# Altium schematic symbol library IC_TI.SCHLIB: 1162 symbols (part 1 of 8)
Pins are listed as number, name and electrical type; pins without a type are passive.

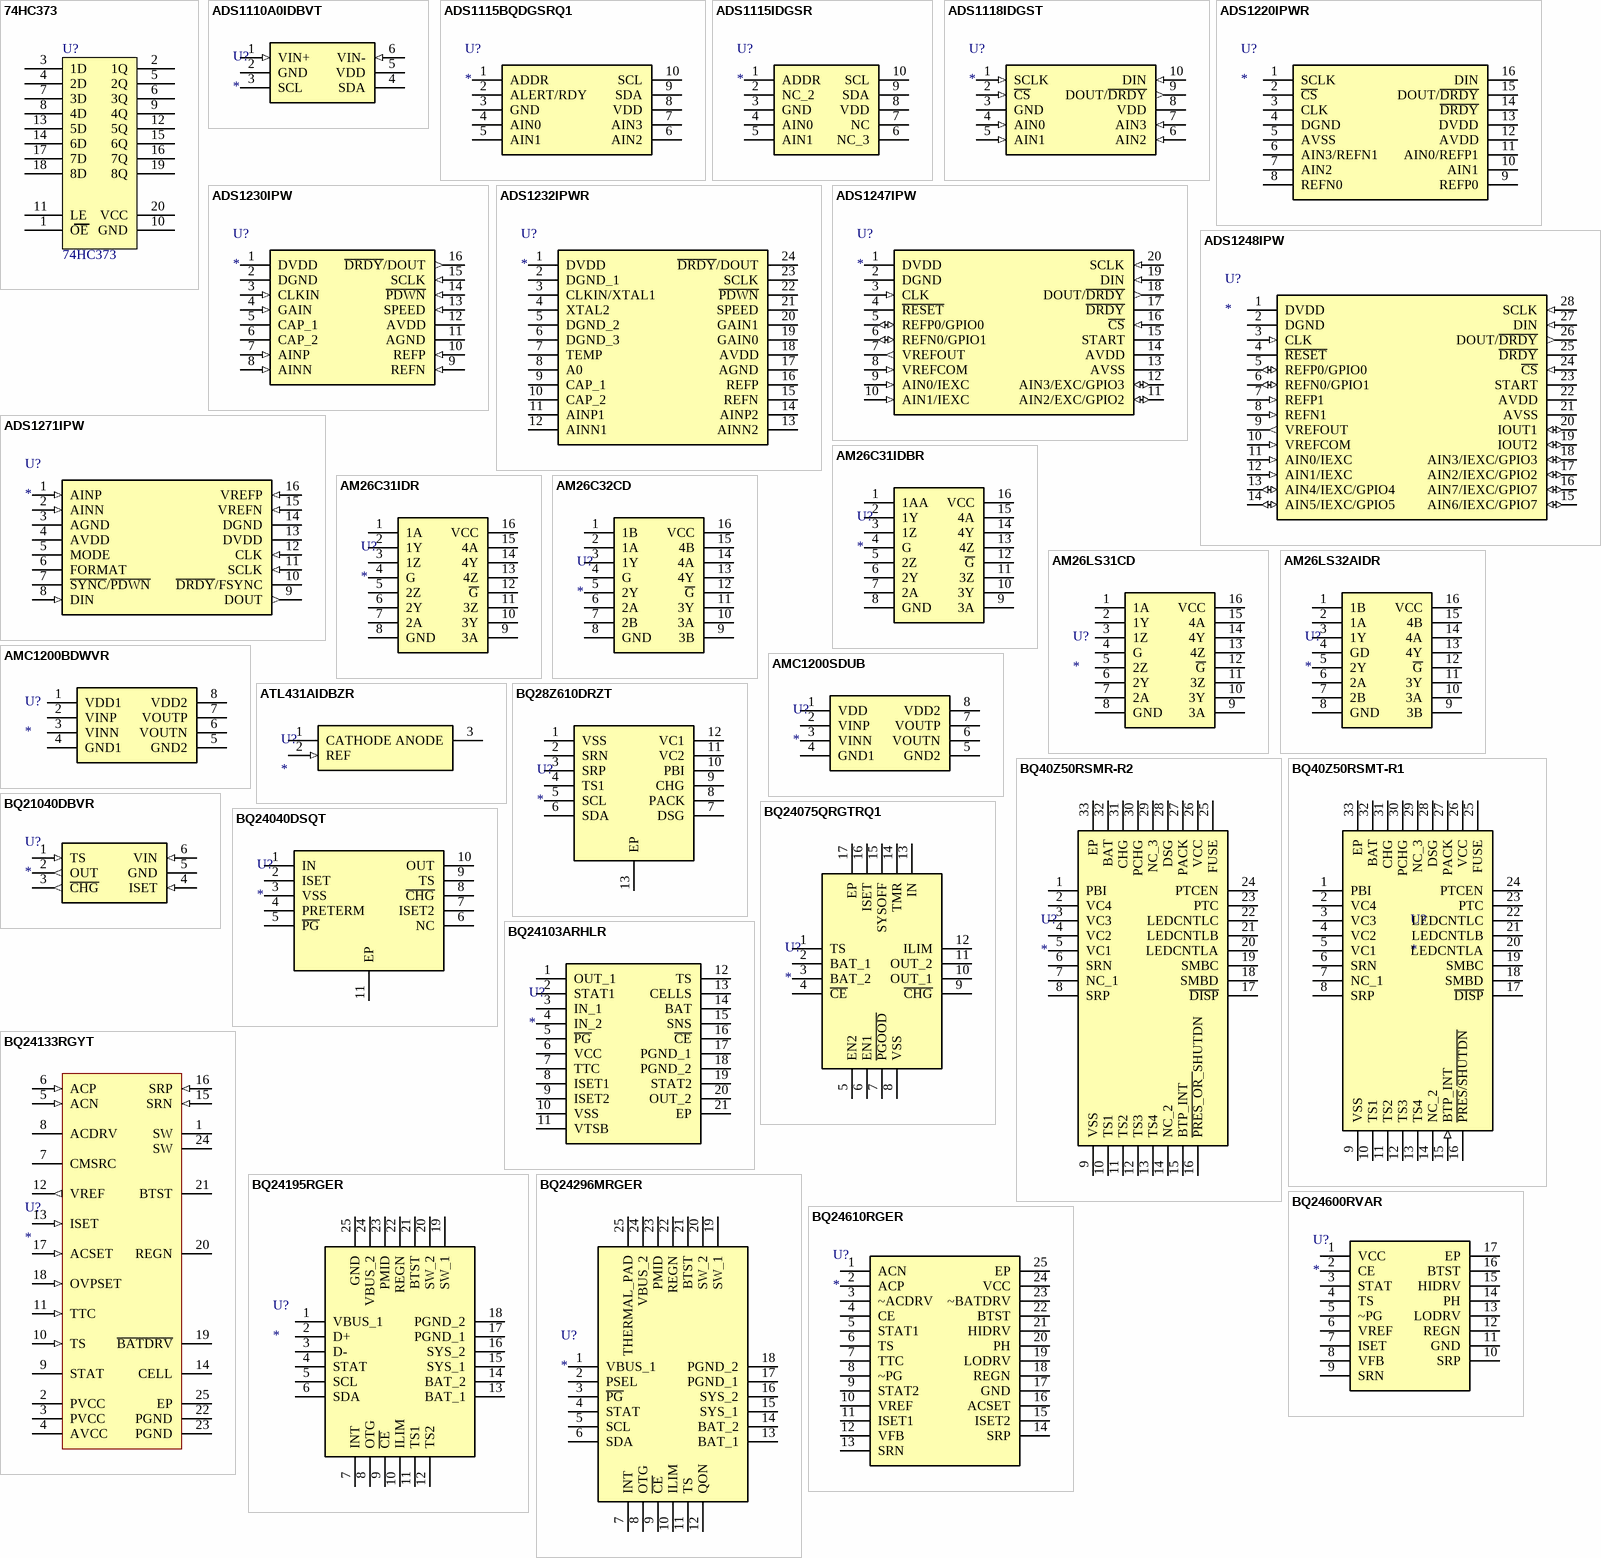
[diagram p0: symbols 74HC373 to BQ24610RGER]

## 74HC373
designator U?
footprint SOIC20W_1.27
pins: 1 OE, 2 1Q, 3 1D, 4 2D, 5 2Q, 6 3Q, 7 3D, 8 4D, 9 4Q, 10 GND, 11 LE, 12 5Q, 13 5D, 14 6D, 15 6Q, 16 7Q, 17 7D, 18 8D, 19 8Q, 20 VCC

## ADS1110A0IDBVT
designator U?
Integrated Circuit; Manufacturer_Name: Texas Instruments; Manufacturer_Part_Number: ADS1110A0IDBVT; Datasheet Link: http://www.ti.com/lit/ds/symlink/ads1110.pdf; Height: 1.45mm; Mouser Part Number: 595-ADS1110A0IDBVT; Mouser Price/Stock: https://www.mouser.com/Search/Refine.aspx?Keyword=595-ADS1110A0IDBVT; RS Part Number: 9233707; RS Price/Stock: http://uk.rs-online.com/web/p/products/9233707
footprint SOT23-6
pins: 1 VIN+ (in), 2 GND (power), 3 SCL, 4 SDA, 5 VDD (power), 6 VIN- (in)

## ADS1115BQDGSRQ1
designator U?
Integrated Circuit; Manufacturer_Name: Texas Instruments; Manufacturer_Part_Number: ADS1115BQDGSRQ1; Datasheet Link: http://www.ti.com/lit/gpn/ads1115-q1; Height: 1.1mm; Mouser Part Number: 595-ADS1115BQDGSRQ1; Mouser Price/Stock: https://www.mouser.com/Search/Refine.aspx?Keyword=595-ADS1115BQDGSRQ1
footprint VSSOP10_0.5
pins: 1 ADDR, 2 ALERT/RDY, 3 GND, 4 AIN0, 5 AIN1, 6 AIN2, 7 AIN3, 8 VDD, 9 SDA, 10 SCL

## ADS1115IDGSR
designator U?
Integrated Circuit; Manufacturer_Name: Texas Instruments; Manufacturer_Part_Number: ADS1115IDGSR; Mouser Part Number: 595-ADS1115IDGSR; Mouser Price/Stock: https://www.mouser.com/Search/Refine.aspx?Keyword=595-ADS1115IDGSR
footprint VSSOP10_0.5
pins: 1 ADDR, 2 NC_2, 3 GND, 4 AIN0, 5 AIN1, 6 NC_3, 7 NC, 8 VDD, 9 SDA, 10 SCL

## ADS1118IDGST
designator U?
Integrated Circuit; Manufacturer_Name: Texas Instruments; Manufacturer_Part_Number: ADS1118IDGST; Datasheet Link: http://www.ti.com/lit/ds/symlink/ads1118.pdf; Height: 1.1mm; Mouser Part Number: 595-ADS1118IDGST; Mouser Price/Stock: https://www.mouser.com/Search/Refine.aspx?Keyword=595-ADS1118IDGST; RS Part Number: 9215315; RS Price/Stock: http://uk.rs-online.com/web/p/products/9215315
footprint VSSOP10_0.5
pins: 1 SCLK (in), 2 ~{CS} (in), 3 GND (power), 4 AIN0 (in), 5 AIN1 (in), 6 AIN2 (in), 7 AIN3 (in), 8 VDD (power), 9 DOUT/~{DRDY} (out), 10 DIN (in)

## ADS1220IPWR
designator U?
Integrated Circuit; Manufacturer_Name: Texas Instruments; Manufacturer_Part_Number: ADS1220IPWR; Datasheet Link: http://www.ti.com/lit/gpn/ads1220; Height: 1.2mm; Mouser Part Number: 595-ADS1220IPWR; Mouser Price/Stock: https://www.mouser.com/Search/Refine.aspx?Keyword=595-ADS1220IPWR
footprint TSSOP16_0.65 (Shrink Small Outline; 16 Leads; Body Width 4.4 mm; Pitch 0.65 mm)
pins: 1 SCLK, 2 ~{CS}, 3 CLK, 4 DGND, 5 AVSS, 6 AIN3/REFN1, 7 AIN2, 8 REFN0, 9 REFP0, 10 AIN1, 11 AIN0/REFP1, 12 AVDD, 13 DVDD, 14 ~{DRDY}, 15 DOUT/~{DRDY}, 16 DIN

## ADS1230IPW
designator U?
Integrated Circuit; Manufacturer_Name: Texas Instruments; Manufacturer_Part_Number: ADS1230IPW; Datasheet Link: http://www.ti.com/lit/ds/symlink/ads1230.pdf; Height: 1.2mm; Mouser Part Number: 595-ADS1230IPW; Mouser Price/Stock: https://www.mouser.com/Search/Refine.aspx?Keyword=595-ADS1230IPW; RS Part Number: 6604188P; RS Price/Stock: http://uk.rs-online.com/web/p/products/6604188P
footprint TSSOP16_0.65 (Shrink Small Outline; 16 Leads; Body Width 4.4 mm; Pitch 0.65 mm)
pins: 1 DVDD (power), 2 DGND (power), 3 CLKIN (in), 4 GAIN (in), 5 CAP_1, 6 CAP_2, 7 AINP (in), 8 AINN (in), 9 REFN (in), 10 REFP (in), 11 AGND (power), 12 AVDD (power), 13 SPEED (in), 14 ~{PDWN} (in), 15 SCLK (in), 16 ~{DRDY}/DOUT (out)

## ADS1232IPWR
designator U?
Integrated Circuit; Manufacturer_Name: Texas Instruments; Manufacturer_Part_Number: ADS1232IPWR; Datasheet Link: http://www.ti.com/lit/ds/symlink/ads1232.pdf; Height: 1.2mm; Mouser Part Number: 595-ADS1232IPWR; Mouser Price/Stock: https://www.mouser.com/Search/Refine.aspx?Keyword=595-ADS1232IPWR
footprint TSSOP24_0.65 (TSOP, 24-Leads, Body 7.80x4.40mm, Pitch 0.65mm, Thermal Pad 5.16x2.40mm, IPC Low Density)
pins: 1 DVDD, 2 DGND_1, 3 CLKIN/XTAL1, 4 XTAL2, 5 DGND_2, 6 DGND_3, 7 TEMP, 8 A0, 9 CAP_1, 10 CAP_2, 11 AINP1, 12 AINN1, 13 AINN2, 14 AINP2, 15 REFN, 16 REFP, 17 AGND, 18 AVDD, 19 GAIN0, 20 GAIN1, 21 SPEED, 22 ~{PDWN}, 23 SCLK, 24 ~{DRDY}/DOUT

## ADS1247IPW
designator U?
Integrated Circuit; Manufacturer_Name: Texas Instruments; Manufacturer_Part_Number: ADS1247IPW; Datasheet Link: http://docs-emea.rs-online.com/webdocs/0e92/0900766b80e92e4c.pdf; Height: 1.2mm; Mouser Part Number: 595-ADS1247IPW; Mouser Price/Stock: https://www.mouser.com/Search/Refine.aspx?Keyword=595-ADS1247IPW; RS Part Number: 7091930P; RS Price/Stock: http://uk.rs-online.com/web/p/products/7091930P
footprint TSSOP20_0.65 (TSOP, 20-Leads, Body 6.6x4.5mm (max), Pitch 0.65mm, IPC Medium Density)
pins: 1 DVDD (power), 2 DGND (power), 3 CLK (in), 4 ~{RESET}, 5 REFP0/GPIO0 (io), 6 REFN0/GPIO1 (io), 7 VREFOUT (out), 8 VREFCOM (in), 9 AIN0/IEXC (in), 10 AIN1/IEXC (in), 11 AIN2/EXC/GPIO2 (io), 12 AIN3/EXC/GPIO3 (io), 13 AVSS (power), 14 AVDD (power), 15 START, 16 ~{CS} (in), 17 ~{DRDY}, 18 DOUT/~{DRDY} (out), 19 DIN (in), 20 SCLK (in)

## ADS1248IPW
designator U?
Integrated Circuit; Manufacturer_Name: Texas Instruments; Manufacturer_Part_Number: ADS1248IPW; Datasheet Link: http://www.ti.com/lit/ds/symlink/ads1248.pdf; Height: 1.2mm; Mouser Part Number: 595-ADS1248IPW; Mouser Price/Stock: https://www.mouser.com/Search/Refine.aspx?Keyword=595-ADS1248IPW; RS Part Number: 7091921P; RS Price/Stock: http://uk.rs-online.com/web/p/products/7091921P
footprint TSSOP28_0.65
pins: 1 DVDD (power), 2 DGND (power), 3 CLK (in), 4 ~{RESET}, 5 REFP0/GPIO0 (io), 6 REFN0/GPIO1 (io), 7 REFP1 (in), 8 REFN1 (in), 9 VREFOUT (out), 10 VREFCOM (in), 11 AIN0/IEXC (in), 12 AIN1/IEXC (in), 13 AIN4/IEXC/GPIO4 (io), 14 AIN5/IEXC/GPIO5 (io), 15 AIN6/IEXC/GPIO7 (io), 16 AIN7/IEXC/GPIO7 (io), 17 AIN2/IEXC/GPIO2 (io), 18 AIN3/IEXC/GPIO3 (io), 19 IOUT2 (io), 20 IOUT1 (io), 21 AVSS (power), 22 AVDD (power), 23 START, 24 ~{CS} (in), 25 ~{DRDY}, 26 DOUT/~{DRDY} (out), 27 DIN (in), 28 SCLK (in)

## ADS1271IPW
designator U?
Integrated Circuit; Manufacturer_Name: Texas Instruments; Manufacturer_Part_Number: ADS1271IPW; Datasheet Link: http://www.ti.com/lit/ds/symlink/ads1271.pdf; Height: 1.2mm; Mouser Part Number: 595-ADS1271IPW; Mouser Price/Stock: https://www.mouser.com/Search/Refine.aspx?Keyword=595-ADS1271IPW; RS Part Number: 5457372P; RS Price/Stock: http://uk.rs-online.com/web/p/products/5457372P
footprint TSSOP16_0.65 (Shrink Small Outline; 16 Leads; Body Width 4.4 mm; Pitch 0.65 mm)
pins: 1 AINP (in), 2 AINN (in), 3 AGND (power), 4 AVDD (power), 5 MODE, 6 FORMAT, 7 ~{SYNC}/~{PDWN}, 8 DIN (in), 9 DOUT (out), 10 ~{DRDY}/FSYNC, 11 SCLK (in), 12 CLK (in), 13 DVDD (power), 14 DGND (power), 15 VREFN (in), 16 VREFP (in)

## AM26C31IDBR
designator U?
Integrated Circuit; Manufacturer_Name: Texas Instruments; Manufacturer_Part_Number: AM26C31IDBR; Datasheet Link: http://www.ti.com/lit/gpn/am26c31; Height: 2mm; Mouser Part Number: 595-AM26C31IDBR; Mouser Price/Stock: https://www.mouser.com/Search/Refine.aspx?Keyword=595-AM26C31IDBR
footprint SSOP16_0.65
pins: 1 1AA, 2 1Y, 3 1Z, 4 G, 5 2Z, 6 2Y, 7 2A, 8 GND, 9 3A, 10 3Y, 11 3Z, 12 ~{G}, 13 4Z, 14 4Y, 15 4A, 16 VCC

## AM26C31IDR
designator U?
Integrated Circuit; Manufacturer_Name: Texas Instruments; Manufacturer_Part_Number: AM26C31IDR; Datasheet Link: http://www.ti.com/lit/ds/symlink/am26c31.pdf; Height: 1.75mm; Mouser Part Number: 595-AM26C31IDR; Mouser Price/Stock: https://www.mouser.com/Search/Refine.aspx?Keyword=595-AM26C31IDR; RS Part Number: 6608164P; RS Price/Stock: http://uk.rs-online.com/web/p/products/6608164P
footprint SOIC16_1.27
pins: 1 1A, 2 1Y, 3 1Z, 4 G, 5 2Z, 6 2Y, 7 2A, 8 GND (power), 9 3A, 10 3Y, 11 3Z, 12 ~{G}, 13 4Z, 14 4Y, 15 4A, 16 VCC (power)

## AM26C32CD
designator U?
Integrated Circuit; Manufacturer_Name: Texas Instruments; Manufacturer_Part_Number: AM26C32CD; Datasheet Link: http://www.ti.com/lit/ds/symlink/am26c32.pdf; Height: 1.75mm; Mouser Part Number: 595-AM26C32CD; Mouser Price/Stock: https://www.mouser.com/Search/Refine.aspx?Keyword=595-AM26C32CD; RS Part Number: 5170542P; RS Price/Stock: http://uk.rs-online.com/web/p/products/5170542P
footprint SOIC16_1.27
pins: 1 1B, 2 1A, 3 1Y, 4 G, 5 2Y, 6 2A, 7 2B, 8 GND (power), 9 3B, 10 3A, 11 3Y, 12 ~{G}, 13 4Y, 14 4A, 15 4B, 16 VCC (power)

## AM26LS31CD
designator U?
Integrated Circuit; Manufacturer_Name: Texas Instruments; Manufacturer_Part_Number: AM26LS31CD; Datasheet Link: http://www.ti.com/lit/ds/symlink/am26ls31.pdf; Height: 1.75mm; Mouser Part Number: 595-AM26LS31CD; Mouser Price/Stock: https://www.mouser.com/Search/Refine.aspx?Keyword=595-AM26LS31CD; RS Part Number: 5173119P; RS Price/Stock: http://uk.rs-online.com/web/p/products/5173119P
footprint SOIC16_1.27
pins: 1 1A, 2 1Y, 3 1Z, 4 G, 5 2Z, 6 2Y, 7 2A, 8 GND (power), 9 3A, 10 3Y, 11 3Z, 12 ~{G}, 13 4Z, 14 4Y, 15 4A, 16 VCC (power)

## AM26LS32AIDR
designator U?
Integrated Circuit; Manufacturer_Name: Texas Instruments; Manufacturer_Part_Number: AM26LS32AIDR; Datasheet Link: http://www.ti.com/lit/gpn/am26ls32a; Height: 1.75mm; Mouser Part Number: 595-AM26LS32AIDR; Mouser Price/Stock: https://www.mouser.com/Search/Refine.aspx?Keyword=595-AM26LS32AIDR
footprint SOIC16_1.27
pins: 1 1B, 2 1A, 3 1Y, 4 GD, 5 2Y, 6 2A, 7 2B, 8 GND, 9 3B, 10 3A, 11 3Y, 12 ~{G}, 13 4Y, 14 4A, 15 4B, 16 VCC

## AMC1200BDWVR
designator U?
Integrated Circuit; Manufacturer_Name: Texas Instruments; Manufacturer_Part_Number: AMC1200BDWVR; Datasheet Link: http://www.ti.com/lit/gpn/amc1200; Height: 2.8mm; Mouser Part Number: 595-AMC1200BDWVR; Mouser Price/Stock: https://www.mouser.com/Search/Refine.aspx?Keyword=595-AMC1200BDWVR
footprint SOIC8W_1.27
pins: 1 VDD1, 2 VINP, 3 VINN, 4 GND1, 5 GND2, 6 VOUTN, 7 VOUTP, 8 VDD2

## AMC1200SDUB
designator U?
Integrated Circuit; Manufacturer_Name: Texas Instruments; Manufacturer_Part_Number: AMC1200SDUB; Datasheet Link: http://www.farnell.com/datasheets/1973077.pdf; Height: 4.85mm; Mouser Part Number: 595-AMC1200SDUB; Mouser Price/Stock: https://www.mouser.com/Search/Refine.aspx?Keyword=595-AMC1200SDUB; RS Part Number: 8175789P; RS Price/Stock: http://uk.rs-online.com/web/p/products/8175789P
footprint SOP8 (SOP, 8-Leads, Body 9.6x6.7mm (max), Pitch 2.54mm, IPC Medium Density)
pins: 1 VDD, 2 VINP, 3 VINN, 4 GND1, 5 GND2, 6 VOUTN, 7 VOUTP, 8 VDD2

## ATL431AIDBZR
designator U?
Integrated Circuit; Manufacturer_Name: Texas Instruments; Manufacturer_Part_Number: ATL431AIDBZR; Datasheet Link: http://www.ti.com/lit/ds/symlink/atl431.pdf; Height: 1.12mm; Mouser Part Number: 595-ATL431AIDBZR; Mouser Price/Stock: https://www.mouser.com/Search/Refine.aspx?Keyword=595-ATL431AIDBZR; RS Part Number: 7974816
footprint SOT23-3 (贴片MOS的SOT-23封装)
pins: 1 CATHODE, 2 REF (in), 3 ANODE

## BQ28Z610DRZT
designator U?
Integrated Circuit; Manufacturer_Name: Texas Instruments; Manufacturer_Part_Number: BQ28Z610DRZT; Datasheet Link: http://www.ti.com/lit/ds/symlink/bq28z610.pdf; Height: 1mm; Mouser Part Number: 595-BQ28Z610DRZT; Mouser Price/Stock: https://www.mouser.com/Search/Refine.aspx?Keyword=595-BQ28Z610DRZT
footprint DFN12_0.4-PAD(2.5X4)
pins: 1 VSS, 2 SRN, 3 SRP, 4 TS1, 5 SCL, 6 SDA, 7 DSG, 8 PACK, 9 CHG, 10 PBI, 11 VC2, 12 VC1, 13 EP

## BQ40Z50RSMR-R2
designator U?
Integrated Circuit; Manufacturer_Name: Texas Instruments; Manufacturer_Part_Number: BQ40Z50RSMR-R2; Datasheet Link: http://www.ti.com/lit/gpn/bq40z50-r2; Height: 1mm; Mouser Part Number: 595-BQ40Z50RSMR-R2; Mouser Price/Stock: https://www.mouser.com/Search/Refine.aspx?Keyword=595-BQ40Z50RSMR-R2
footprint QFN32_0.4-PAD(4X4) (QFN, 32-Leads, Body 5.2x5.2mm (max), Pitch 0.50mm, IPC Medium Density)
pins: 1 PBI, 2 VC4, 3 VC3, 4 VC2, 5 VC1, 6 SRN, 7 NC_1, 8 SRP, 9 VSS, 10 TS1, 11 TS2, 12 TS3, 13 TS4, 14 NC_2, 15 BTP_INT, 16 ~{PRES_OR_}SHUTDN, 17 ~{DISP}, 18 SMBD, 19 SMBC, 20 LEDCNTLA, 21 LEDCNTLB, 22 LEDCNTLC, 23 PTC, 24 PTCEN, 25 FUSE, 26 VCC, 27 PACK, 28 DSG, 29 NC_3, 30 PCHG, 31 CHG, 32 BAT, 33 EP

## BQ40Z50RSMT-R1
designator U?
Integrated Circuit; Manufacturer_Name: Texas Instruments; Manufacturer_Part_Number: BQ40Z50RSMT-R1; Datasheet Link: http://www.ti.com/lit/ds/symlink/bq40z50-r1.pdf; Height: 1mm; Mouser Part Number: 595-BQ40Z50RSMT-R1; Mouser Price/Stock: https://www.mouser.com/Search/Refine.aspx?Keyword=595-BQ40Z50RSMT-R1; RS Part Number: 1330141; RS Price/Stock: http://uk.rs-online.com/web/p/products/1330141
footprint QFN32_0.4-PAD(4X4) (QFN, 32-Leads, Body 5.2x5.2mm (max), Pitch 0.50mm, IPC Medium Density)
pins: 1 PBI, 2 VC4, 3 VC3, 4 VC2, 5 VC1, 6 SRN, 7 NC_1, 8 SRP, 9 VSS (power), 10 TS1, 11 TS2, 12 TS3, 13 TS4, 14 NC_2, 15 BTP_INT (in), 16 ~{PRES}/~{SHUTDN}, 17 ~{DISP}, 18 SMBD, 19 SMBC, 20 LEDCNTLA, 21 LEDCNTLB, 22 LEDCNTLC, 23 PTC, 24 PTCEN, 25 FUSE, 26 VCC (power), 27 PACK, 28 DSG, 29 NC_3, 30 PCHG, 31 CHG, 32 BAT, 33 EP

## BQ21040DBVR
designator U?
Integrated Circuit; Manufacturer_Name: Texas Instruments; Manufacturer_Part_Number: BQ21040DBVR; Datasheet Link: http://www.ti.com/lit/gpn/bq21040; Height: 1.45mm; Mouser Part Number: 595-BQ21040DBVR; Mouser Price/Stock: https://www.mouser.com/Search/Refine.aspx?Keyword=595-BQ21040DBVR
footprint SOT23-6
pins: 1 TS (in), 2 OUT (out), 3 ~{CHG} (out), 4 ISET (in), 5 GND (power), 6 VIN (in)

## BQ24040DSQT
designator U?
Integrated Circuit; Manufacturer_Name: Texas Instruments; Manufacturer_Part_Number: BQ24040DSQT; Datasheet Link: http://www.ti.com/lit/ds/symlink/bq24040.pdf; Height: 0.8mm; Mouser Part Number: 595-BQ24040DSQT; Mouser Price/Stock: https://www.mouser.com/Search/Refine.aspx?Keyword=595-BQ24040DSQT; RS Part Number: 1628082; RS Price/Stock: http://uk.rs-online.com/web/p/products/1628082
footprint DFN10_0.4-PAD(2X2)
pins: 1 IN, 2 ISET, 3 VSS, 4 PRETERM, 5 ~{PG}, 6 NC, 7 ISET2, 8 ~{CHG}, 9 TS, 10 OUT, 11 EP

## BQ24075QRGTRQ1
designator U?
Integrated Circuit; Manufacturer_Name: Texas Instruments; Manufacturer_Part_Number: BQ24075QRGTRQ1; Datasheet Link: http://www.ti.com/lit/gpn/bq24075-q1; Height: 1mm; Mouser Part Number: 595-BQ24075QRGTRQ1; Mouser Price/Stock: https://www.mouser.com/Search/Refine.aspx?Keyword=595-BQ24075QRGTRQ1
footprint QFN16_0.5-PAD(3X3) (QFN, 16-Leads, Body 3.0x3.0mm (max), Pitch 0.50mm, IPC Low Density)
pins: 1 TS, 2 BAT_1, 3 BAT_2, 4 ~{CE}, 5 EN2, 6 EN1, 7 ~{PGOOD}, 8 VSS, 9 ~{CHG}, 10 OUT_1, 11 OUT_2, 12 ILIM, 13 IN, 14 TMR, 15 SYSOFF, 16 ISET, 17 EP

## BQ24103ARHLR
designator U?
Integrated Circuit; Manufacturer_Name: Texas Instruments; Manufacturer_Part_Number: BQ24103ARHLR; Datasheet Link: http://www.ti.com/lit/gpn/bq24103a; Mouser Part Number: 595-BQ24103ARHLR; Mouser Price/Stock: https://www.mouser.com/Search/Refine.aspx?Keyword=595-BQ24103ARHLR
footprint BQ51050BRHLR
pins: 1 OUT_1, 2 STAT1, 3 IN_1, 4 IN_2, 5 ~{PG}, 6 VCC, 7 TTC, 8 ISET1, 9 ISET2, 10 VSS, 11 VTSB, 12 TS, 13 CELLS, 14 BAT, 15 SNS, 16 ~{CE}, 17 PGND_1, 18 PGND_2, 19 STAT2, 20 OUT_2, 21 EP

## BQ24133RGYT
designator U?
Integrated Circuit; Manufacturer_Name: Texas Instruments; Manufacturer_Part_Number: BQ24133RGYT; Datasheet Link: http://www.ti.com/lit/ds/symlink/bq24133.pdf; Mouser Part Number: 595-BQ24133RGYT; Mouser Price/Stock: https://www.mouser.com/Search/Refine.aspx?Keyword=595-BQ24133RGYT; RS Part Number: 8279263P; RS Price/Stock: http://uk.rs-online.com/web/p/products/8279263P
footprint VQFN24_0.5-PAD(3.5X5.5)
pins: 1 SW (power) "Switching node, charge current output inductor connection. Connect the 0.047-uF bootstrap capacitor from SW to BTST.", 2 PVCC (power) "Charger input voltage. Connect at least 10-uF ceramic capacitor from PVCC to PGND and place it as close as possible to IC", 3 PVCC (power) "Charger input voltage. Connect at least 10-uF ceramic capacitor from PVCC to PGND and place it as close as possible to IC", 4 AVCC (power) "IC power positive supply. Place a 1-uF ceramic capacitor from AVCC to AGND and place it as close as possible to IC. Place a 10-ohm resistor from input side to AVCC pin to filter the noise. For 5V input, a 5-ohm resistor is (See Datasheet)", 5 ACN (in) "Adapter current sense resistor negative input. A 0.1-uF ceramic capacitor is placed from ACN to ACP to provide differential-mode filtering. An optional 0.1-uF ceramic capacitor is placed from ACN pin to AGND for common-mode (See Datasheet)", 6 ACP (in) "Adapter current sense resistor positive input. A 0.1-uF ceramic capacitor is placed from ACN to ACP to provide differential-mode filtering. A 0.1-uF ceramic capacitor is placed from ACP pin to AGND for common-mode filtering.", 7 CMSRC "Connect to common source of N-channel ACFET and reverse blocking MOSFET (RBFET). Place 4-kohm resistor from CMSRC pin to the common source of ACFET and RBFET to control the turn-on speed. The resistance between ACDRV and (See Datasheet)", 8 ACDRV "AC adapter to system switch driver output. Connect to 4-kohm resistor then to the gate of the ACFET N-channel power MOSFET and the reverse conduction blocking N-channel power MOSFET. Connect both FETs as common-source. The (See Datasheet)", 9 STAT (hiz) "Open-drain charge status pin with 10-k ohm pull up to power rail. The STAT pin can be used to drive LED or communicate with the host processor. It indicates various charger operations: LOW when charge in progress. HIGH when (See Datasheet)", 10 TS (in) "Temperature qualification voltage input. Connect a negative temperature coefficient thermistor. Program the hot and cold temperature window with a resistor divider from VREF to TS to AGND. The temperature qualification (See Datasheet)", 11 TTC (in) "Safety Timer and termination control. Connect a capacitor from this node to AGND to set the fast charge safety timer(5.6min/nF). Pre-charge timer is internally fixed to 30 minutes. Pull the TTC to LOW to disable the charge (See Datasheet)", 12 VREF (out) "3.3V reference voltage output. Place a 1-uF ceramic capacitor from VREF to AGND pin close to the IC. This voltage could be used for programming ISET and ACSET and TS pins. It may also serve as the pull-up rail of STAT pin (See Datasheet)", 13 ISET (in) "Fast charge current set point. Use a voltage divider from VREF to ISET to AGND to set the fast charge current: ICHG=VISET/(20*RSR) The pre-charge and termination current is internally as one tenth of the charge current. The (See Datasheet)", 14 CELL "Cell selection pin. Set CELL pin LOW for 1-cell, Float for 2-cell (0.8V-1.8V), and HIGH for 3-cell with a fixed 4.2V per cell.", 15 SRN (in) "Charge current sense resistor negative input. A 0.1-uF ceramic capacitor is placed from SRN to SRP to provide differential-mode filtering. A 0.1-uF ceramic capacitor is placed from SRN pin to AGND for common-mode filtering.", 16 SRP (in) "Charge current sense resistor, positive input. A 0.1-uF ceramic capacitor is placed from SRN to SRP to provide differential-mode filtering. A 0.1-uF ceramic capacitor is placed from SRP pin to AGND for common-mode filtering.", 17 ACSET (in) "Input current set point. Use a voltage divider from VREF to ACSET to AGND to set this value:IDPM=VACSET/(20*RAC)", 18 OVPSET (in) "Valid input voltage set point. Use a voltage divider from input to OVPSET to AGND to set this voltage. The voltage above internal 1.6V reference indicates input over-voltage, and the voltage below internal 0.5V reference (See Datasheet)", 19 ~{BATDRV} "Battery discharge MOSFET gate driver output. Connect to 1kohm resistor to the gate of the BATFET P-channel power MOSFET. Connect the source of the BATFET to the system load voltage node. Connect the drain of the BATFET to (See Datasheet)", 20 REGN (power) "PWM low side driver positive 6V supply output. Connect a 1-uF ceramic capacitor from REGN to PGND pin, close to the IC. Generate high-side driver bootstrap voltage by integrated diode from REGN to BTST", 21 BTST (power) "PWM high side driver positive supply. Connect the 0.047-uF bootstrap capacitor from SW to BTST.", 22 PGND (power) "Power ground. Ground connection for high-current power converter node. On PCB layout, connect directly to ground connection of input and output capacitors of the charger. Only connect to AGND through the Thermal Pad (See Datasheet)", 23 PGND (power) "Power ground. Ground connection for high-current power converter node. On PCB layout, connect directly to ground connection of input and output capacitors of the charger. Only connect to AGND through the Thermal Pad (See Datasheet)", 24 SW (power) "Switching node, charge current output inductor connection. Connect the 0.047-uF bootstrap capacitor from SW to BTST.", 25 EP (power) "Exposed pad beneath the IC. Always solder Thermal Pad to the board, and have vias on the Thermal  Pad plane star-connecting to AGND and ground plane for high-current power converter. It dissipates the heat from the IC."

## BQ24195RGER
designator U?
Integrated Circuit; Manufacturer_Name: Texas Instruments; Manufacturer_Part_Number: BQ24195RGER; Datasheet Link: http://www.ti.com/lit/ds/symlink/bq24195.pdf; Height: 1mm; Mouser Part Number: 595-BQ24195RGER; Mouser Price/Stock: https://www.mouser.com/Search/Refine.aspx?Keyword=595-BQ24195RGER
footprint QFN24_0.5-PAD(4X4) (QFN, 24-Leads, Body 4.1x4.1mm (max), Pitch 0.50mm, IPC Medium Density)
pins: 1 VBUS_1, 2 D+, 3 D-, 4 STAT, 5 SCL, 6 SDA, 7 INT, 8 OTG, 9 ~{CE}, 10 ILIM, 11 TS1, 12 TS2, 13 BAT_1, 14 BAT_2, 15 SYS_1, 16 SYS_2, 17 PGND_1, 18 PGND_2, 19 SW_1, 20 SW_2, 21 BTST, 22 REGN, 23 PMID, 24 VBUS_2, 25 GND

## BQ24296MRGER
designator U?
Integrated Circuit; Manufacturer_Name: Texas Instruments; Manufacturer_Part_Number: BQ24296MRGER; Datasheet Link: http://www.ti.com/lit/gpn/bq24296m; Height: 1mm; Mouser Part Number: 595-BQ24296MRGER; Mouser Price/Stock: https://www.mouser.com/Search/Refine.aspx?Keyword=595-BQ24296MRGER
footprint QFN24_0.5-PAD(4X4) (QFN, 24-Leads, Body 4.1x4.1mm (max), Pitch 0.50mm, IPC Medium Density)
pins: 1 VBUS_1, 2 PSEL, 3 ~{PG}, 4 STAT, 5 SCL, 6 SDA, 7 INT, 8 OTG, 9 ~{CE}, 10 ILIM, 11 TS, 12 QON, 13 BAT_1, 14 BAT_2, 15 SYS_1, 16 SYS_2, 17 PGND_1, 18 PGND_2, 19 SW_1, 20 SW_2, 21 BTST, 22 REGN, 23 PMID, 24 VBUS_2, 25 THERMAL_PAD

## BQ24600RVAR
designator U?
Integrated Circuit; Manufacturer_Name: Texas Instruments; Manufacturer_Part_Number: BQ24600RVAR; Datasheet Link: http://www.ti.com/lit/gpn/bq24600; Mouser Part Number: 595-BQ24600RVAR; Mouser Price/Stock: https://www.mouser.com/Search/Refine.aspx?Keyword=595-BQ24600RVAR
footprint QFN16_0.5-PAD(3.5X3.5)
pins: 1 VCC, 2 CE, 3 STAT, 4 TS, 5 ~PG, 6 VREF, 7 ISET, 8 VFB, 9 SRN, 10 SRP, 11 GND, 12 REGN, 13 LODRV, 14 PH, 15 HIDRV, 16 BTST, 17 EP

## BQ24610RGER
designator U?
Integrated Circuit; Manufacturer_Name: Texas Instruments; Manufacturer_Part_Number: BQ24610RGER; Datasheet Link: http://www.ti.com/lit/gpn/bq24610; Mouser Part Number: 595-BQ24610RGER; Mouser Price/Stock: https://www.mouser.com/Search/Refine.aspx?Keyword=595-BQ24610RGER
footprint QFN24_0.5-PAD(4X4) (QFN, 24-Leads, Body 4.1x4.1mm (max), Pitch 0.50mm, IPC Medium Density)
pins: 1 ACN, 2 ACP, 3 ~ACDRV, 4 CE, 5 STAT1, 6 TS, 7 TTC, 8 ~PG, 9 STAT2, 10 VREF, 11 ISET1, 12 VFB, 13 SRN, 14 SRP, 15 ISET2, 16 ACSET, 17 GND, 18 REGN, 19 LODRV, 20 PH, 21 HIDRV, 22 BTST, 23 ~BATDRV, 24 VCC, 25 EP

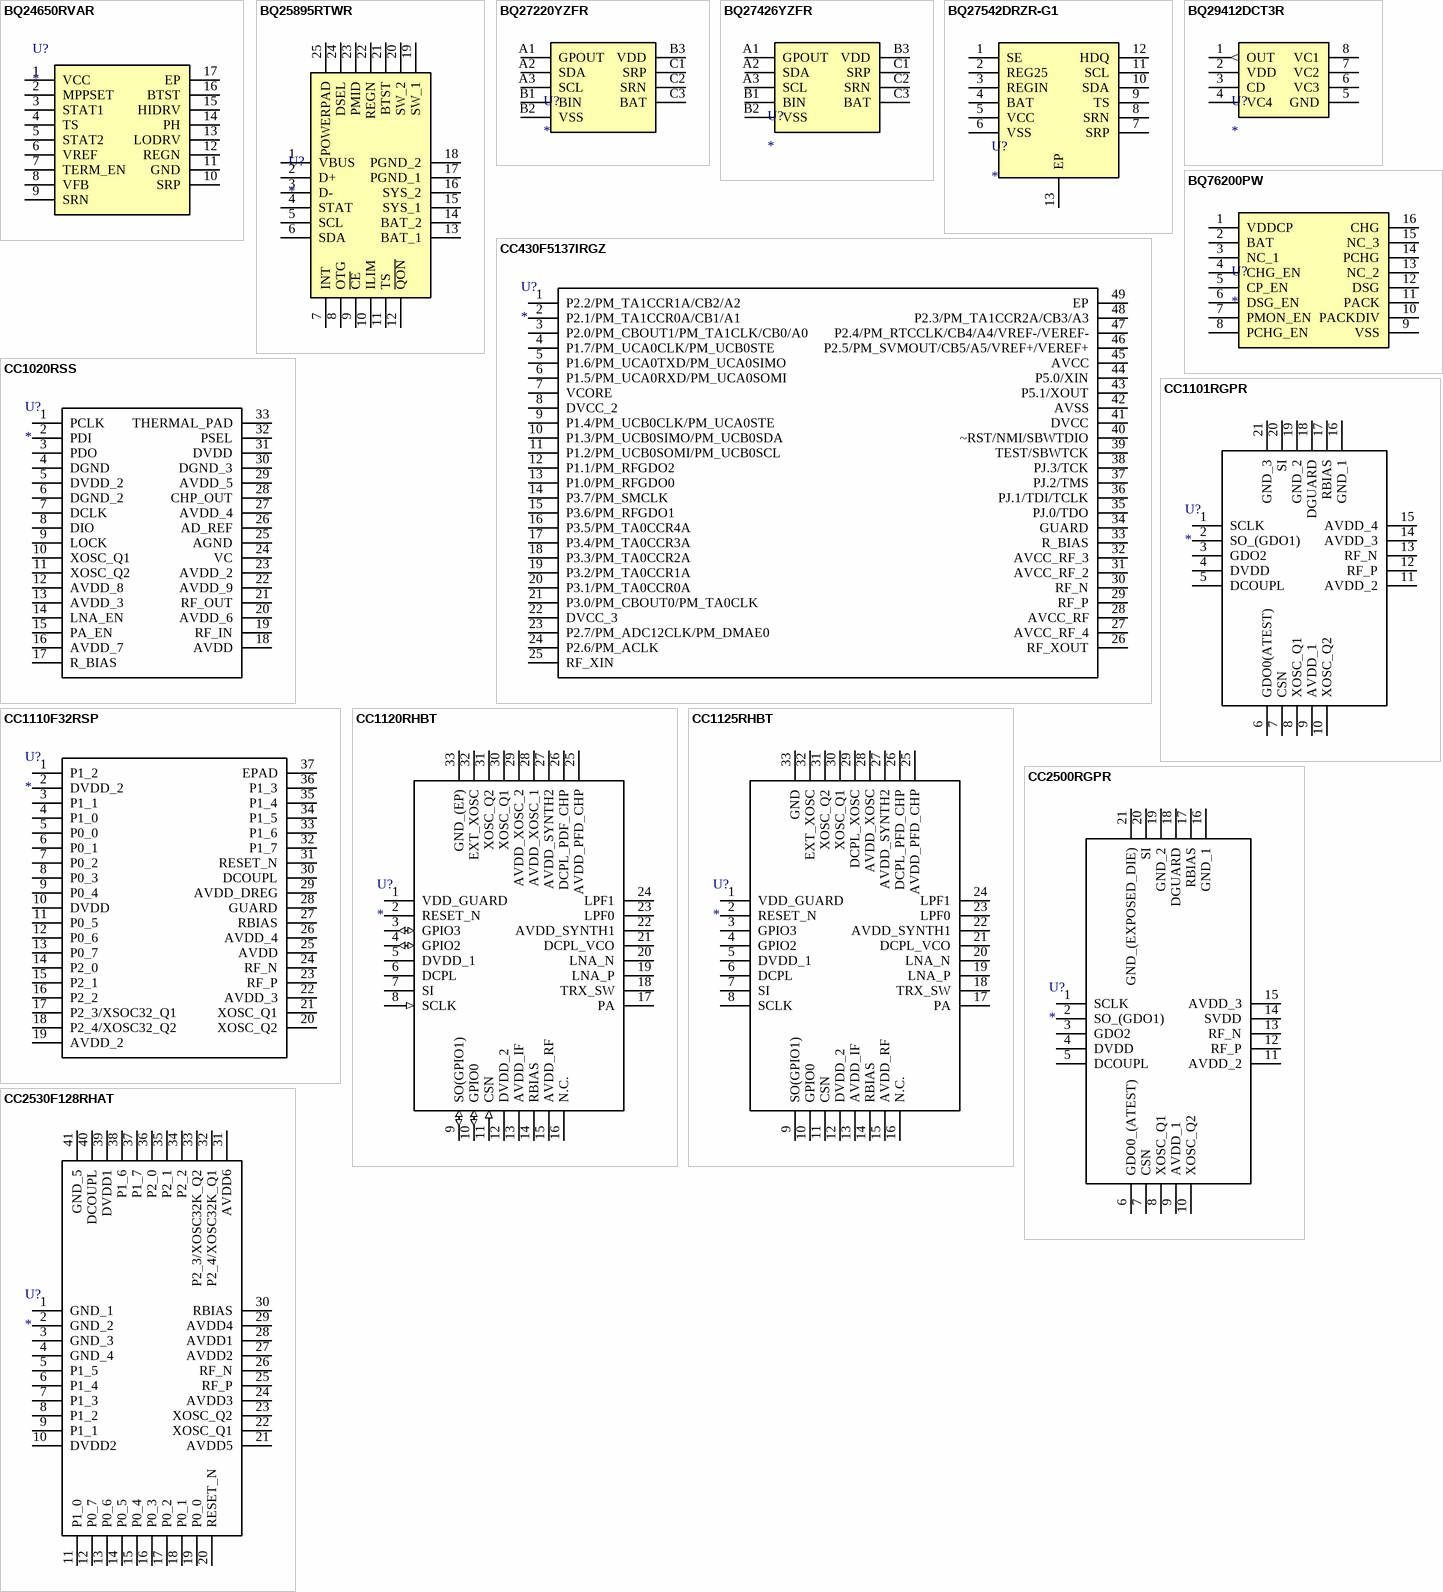
[diagram p1: symbols BQ24650RVAR to CC2530F128RHAT]

## BQ24650RVAR
designator U?
Integrated Circuit; Manufacturer_Name: Texas Instruments; Manufacturer_Part_Number: BQ24650RVAR; Mouser Part Number: 595-BQ24650RVAR; Mouser Price/Stock: https://www.mouser.com/Search/Refine.aspx?Keyword=595-BQ24650RVAR
footprint QFN16_0.5-PAD(3.5X3.5)
pins: 1 VCC, 2 MPPSET, 3 STAT1, 4 TS, 5 STAT2, 6 VREF, 7 TERM_EN, 8 VFB, 9 SRN, 10 SRP, 11 GND, 12 REGN, 13 LODRV, 14 PH, 15 HIDRV, 16 BTST, 17 EP

## BQ25895RTWR
designator U?
Integrated Circuit; Manufacturer_Name: Texas Instruments; Manufacturer_Part_Number: BQ25895RTWR; Datasheet Link: http://www.ti.com/lit/gpn/bq25895; Height: 0.8mm; Mouser Part Number: 595-BQ25895RTWR; Mouser Price/Stock: https://www.mouser.com/Search/Refine.aspx?Keyword=595-BQ25895RTWR
footprint QFN24_0.5-PAD(4X4) (QFN, 24-Leads, Body 4.1x4.1mm (max), Pitch 0.50mm, IPC Medium Density)
pins: 1 VBUS, 2 D+, 3 D-, 4 STAT, 5 SCL, 6 SDA, 7 INT, 8 OTG, 9 ~{CE}, 10 ILIM, 11 TS, 12 ~{QON}, 13 BAT_1, 14 BAT_2, 15 SYS_1, 16 SYS_2, 17 PGND_1, 18 PGND_2, 19 SW_1, 20 SW_2, 21 BTST, 22 REGN, 23 PMID, 24 DSEL, 25 POWERPAD

## BQ27220YZFR
designator U?
Integrated Circuit; Manufacturer_Name: Texas Instruments; Manufacturer_Part_Number: BQ27220YZFR; Datasheet Link: http://www.ti.com/lit/ds/symlink/bq27220.pdf; Height: 0.625mm; Mouser Part Number: 595-BQ27220YZFR; Mouser Price/Stock: https://www.mouser.com/Search/Refine.aspx?Keyword=595-BQ27220YZFR
footprint BGA9_0.5(1.6X1.6)
pins: A1 GPOUT, A2 SDA, A3 SCL, B1 BIN, B2 VSS, B3 VDD, C1 SRP, C2 SRN, C3 BAT

## BQ27426YZFR
designator U?
Integrated Circuit; Manufacturer_Name: Texas Instruments; Manufacturer_Part_Number: BQ27426YZFR; Datasheet Link: http://www.ti.com/lit/gpn/bq27426; Height: 0.625mm; Mouser Part Number: 595-BQ27426YZFR; Mouser Price/Stock: https://www.mouser.com/Search/Refine.aspx?Keyword=595-BQ27426YZFR
footprint BGA9_0.5(1.6X1.6)
pins: A1 GPOUT, A2 SDA, A3 SCL, B1 BIN, B2 VSS, B3 VDD, C1 SRP, C2 SRN, C3 BAT

## BQ27542DRZR-G1
designator U?
Integrated Circuit; Manufacturer_Name: Texas Instruments; Manufacturer_Part_Number: BQ27542DRZR-G1; Datasheet Link: http://www.ti.com/lit/gpn/bq27542-g1; Height: 1mm; Mouser Part Number: 595-BQ27542DRZR-G1; Mouser Price/Stock: https://www.mouser.com/Search/Refine.aspx?Keyword=595-BQ27542DRZR-G1
footprint DFN12_0.4-PAD(2.5X4)
pins: 1 SE, 2 REG25, 3 REGIN, 4 BAT, 5 VCC, 6 VSS, 7 SRP, 8 SRN, 9 TS, 10 SDA, 11 SCL, 12 HDQ, 13 EP

## BQ29412DCT3R
designator U?
Integrated Circuit; Manufacturer_Name: Texas Instruments; Manufacturer_Part_Number: BQ29412DCT3R; Datasheet Link: http://docs-emea.rs-online.com/webdocs/0c94/0900766b80c9497f.pdf; Height: 1.3mm; Mouser Part Number: 595-BQ29412DCT3R; Mouser Price/Stock: https://www.mouser.com/Search/Refine.aspx?Keyword=595-BQ29412DCT3R; RS Part Number: 6622063; RS Price/Stock: http://uk.rs-online.com/web/p/battery-charge-controller-ics/6622063/?source=DS
footprint VSSOP8_0.65(4X3)
pins: 1 OUT (out), 2 VDD (power), 3 CD, 4 VC4, 5 GND (power), 6 VC3, 7 VC2, 8 VC1

## BQ76200PW
designator U?
Integrated Circuit; Manufacturer_Name: Texas Instruments; Manufacturer_Part_Number: BQ76200PW; Datasheet Link: http://www.ti.com/general/docs/lit/getliterature.tsp?genericPartNumber=BQ76200&&fileType=pdf; Height: 1.2mm; Mouser Part Number: 595-BQ76200PW; Mouser Price/Stock: https://www.mouser.com/Search/Refine.aspx?Keyword=595-BQ76200PW; RS Part Number: 1330143P; RS Price/Stock: http://uk.rs-online.com/web/p/products/1330143P
footprint TSSOP16_0.65 (Shrink Small Outline; 16 Leads; Body Width 4.4 mm; Pitch 0.65 mm)
pins: 1 VDDCP, 2 BAT, 3 NC_1, 4 CHG_EN, 5 CP_EN, 6 DSG_EN, 7 PMON_EN, 8 PCHG_EN, 9 VSS, 10 PACKDIV, 11 PACK, 12 DSG, 13 NC_2, 14 PCHG, 15 NC_3, 16 CHG

## CC430F5137IRGZ
designator U?
Integrated Circuit; Manufacturer_Name: Texas Instruments; Manufacturer_Part_Number: CC430F5137IRGZ; Datasheet Link: http://www.ti.com/lit/gpn/cc430f5137; Mouser Part Number: 595-CC430F5137IRGZ; Mouser Price/Stock: https://www.mouser.com/Search/Refine.aspx?Keyword=595-CC430F5137IRGZ; RS Part Number: 9215318; RS Price/Stock: http://uk.rs-online.com/web/p/products/9215318
footprint QFN48_0.5-PAD(7X7) (QFN, 48-Leads, Body 7.2x7.2mm (max), Pitch 0.50mm, IPC Medium Density)
pins: 1 P2.2/PM_TA1CCR1A/CB2/A2, 2 P2.1/PM_TA1CCR0A/CB1/A1, 3 P2.0/PM_CBOUT1/PM_TA1CLK/CB0/A0, 4 P1.7/PM_UCA0CLK/PM_UCB0STE, 5 P1.6/PM_UCA0TXD/PM_UCA0SIMO, 6 P1.5/PM_UCA0RXD/PM_UCA0SOMI, 7 VCORE, 8 DVCC_2, 9 P1.4/PM_UCB0CLK/PM_UCA0STE, 10 P1.3/PM_UCB0SIMO/PM_UCB0SDA, 11 P1.2/PM_UCB0SOMI/PM_UCB0SCL, 12 P1.1/PM_RFGDO2, 13 P1.0/PM_RFGDO0, 14 P3.7/PM_SMCLK, 15 P3.6/PM_RFGDO1, 16 P3.5/PM_TA0CCR4A, 17 P3.4/PM_TA0CCR3A, 18 P3.3/PM_TA0CCR2A, 19 P3.2/PM_TA0CCR1A, 20 P3.1/PM_TA0CCR0A, 21 P3.0/PM_CBOUT0/PM_TA0CLK, 22 DVCC_3, 23 P2.7/PM_ADC12CLK/PM_DMAE0, 24 P2.6/PM_ACLK, 25 RF_XIN, 26 RF_XOUT, 27 AVCC_RF_4, 28 AVCC_RF, 29 RF_P, 30 RF_N, 31 AVCC_RF_2, 32 AVCC_RF_3, 33 R_BIAS, 34 GUARD, 35 PJ.0/TDO, 36 PJ.1/TDI/TCLK, 37 PJ.2/TMS, 38 PJ.3/TCK, 39 TEST/SBWTCK, 40 ~RST/NMI/SBWTDIO, 41 DVCC, 42 AVSS, 43 P5.1/XOUT, 44 P5.0/XIN, 45 AVCC, 46 P2.5/PM_SVMOUT/CB5/A5/VREF+/VEREF+, 47 P2.4/PM_RTCCLK/CB4/A4/VREF-/VEREF-, 48 P2.3/PM_TA1CCR2A/CB3/A3, 49 EP

## CC1020RSS
designator U?
Integrated Circuit; Manufacturer_Name: Texas Instruments; Manufacturer_Part_Number: CC1020RSS
footprint QFN32_0.65-PAD(7X7)
pins: 1 PCLK, 2 PDI, 3 PDO, 4 DGND, 5 DVDD_2, 6 DGND_2, 7 DCLK, 8 DIO, 9 LOCK, 10 XOSC_Q1, 11 XOSC_Q2, 12 AVDD_8, 13 AVDD_3, 14 LNA_EN, 15 PA_EN, 16 AVDD_7, 17 R_BIAS, 18 AVDD, 19 RF_IN, 20 AVDD_6, 21 RF_OUT, 22 AVDD_9, 23 AVDD_2, 24 VC, 25 AGND, 26 AD_REF, 27 AVDD_4, 28 CHP_OUT, 29 AVDD_5, 30 DGND_3, 31 DVDD, 32 PSEL, 33 THERMAL_PAD

## CC1101RGPR
designator U?
Integrated Circuit; Manufacturer_Name: Texas Instruments; Manufacturer_Part_Number: CC1101RGPR; Datasheet Link: http://www.ti.com/lit/gpn/cc1101; Height: 1mm; Mouser Part Number: 595-CC1101RGPR; Mouser Price/Stock: https://www.mouser.com/Search/Refine.aspx?Keyword=595-CC1101RGPR
footprint QFN20_0.5-PAD(4X4)
pins: 1 SCLK, 2 SO_(GDO1), 3 GDO2, 4 DVDD, 5 DCOUPL, 6 GDO0(ATEST), 7 CSN, 8 XOSC_Q1, 9 AVDD_1, 10 XOSC_Q2, 11 AVDD_2, 12 RF_P, 13 RF_N, 14 AVDD_3, 15 AVDD_4, 16 GND_1, 17 RBIAS, 18 DGUARD, 19 GND_2, 20 SI, 21 GND_3

## CC1110F32RSP
designator U?
Integrated Circuit; Manufacturer_Name: Texas Instruments; Manufacturer_Part_Number: CC1110F32RSP; Mouser Part Number: 839-CC1110; Mouser Price/Stock: https://www.mouser.com/Search/Refine.aspx?Keyword=839-CC1110
footprint QFN36_0.5-PAD(6X6)
pins: 1 P1_2, 2 DVDD_2, 3 P1_1, 4 P1_0, 5 P0_0, 6 P0_1, 7 P0_2, 8 P0_3, 9 P0_4, 10 DVDD, 11 P0_5, 12 P0_6, 13 P0_7, 14 P2_0, 15 P2_1, 16 P2_2, 17 P2_3/XSOC32_Q1, 18 P2_4/XOSC32_Q2, 19 AVDD_2, 20 XOSC_Q2, 21 XOSC_Q1, 22 AVDD_3, 23 RF_P, 24 RF_N, 25 AVDD, 26 AVDD_4, 27 RBIAS, 28 GUARD, 29 AVDD_DREG, 30 DCOUPL, 31 RESET_N, 32 P1_7, 33 P1_6, 34 P1_5, 35 P1_4, 36 P1_3, 37 EPAD

## CC1120RHBT
designator U?
Integrated Circuit; Manufacturer_Name: Texas Instruments; Manufacturer_Part_Number: CC1120RHBT; Datasheet Link: http://www.ti.com/lit/ds/symlink/cc1120.pdf; Height: 1mm; Mouser Part Number: 595-CC1120RHBT; Mouser Price/Stock: https://www.mouser.com/Search/Refine.aspx?Keyword=595-CC1120RHBT; RS Part Number: 7984488P; RS Price/Stock: http://uk.rs-online.com/web/p/products/7984488P
footprint QFN32_0.5-PAD(5X5) (QFN, 32-Leads, Body 5.2x5.2mm (max), Pitch 0.50mm, IPC Medium Density)
pins: 1 VDD_GUARD (power), 2 RESET_N, 3 GPIO3 (io), 4 GPIO2 (io), 5 DVDD_1 (power), 6 DCPL, 7 SI, 8 SCLK (in), 9 SO(GPIO1) (io), 10 GPIO0 (io), 11 CSN (in), 12 DVDD_2 (power), 13 AVDD_IF (power), 14 RBIAS, 15 AVDD_RF (power), 16 N.C., 17 PA, 18 TRX_SW, 19 LNA_P, 20 LNA_N, 21 DCPL_VCO, 22 AVDD_SYNTH1 (power), 23 LPF0, 24 LPF1, 25 AVDD_PFD_CHP (power), 26 DCPL_PDF_CHP, 27 AVDD_SYNTH2 (power), 28 AVDD_XOSC_1 (power), 29 AVDD_XOSC_2 (power), 30 XOSC_Q1, 31 XOSC_Q2, 32 EXT_XOSC, 33 GND_(EP) (power)

## CC1125RHBT
designator U?
Integrated Circuit; Manufacturer_Name: Texas Instruments; Manufacturer_Part_Number: CC1125RHBT; Datasheet Link: http://www.ti.com/general/docs/lit/getliterature.tsp?genericPartNumber=CC1125&&fileType=pdf; Height: 1mm; Mouser Part Number: 595-CC1125RHBT; Mouser Price/Stock: https://www.mouser.com/Search/Refine.aspx?Keyword=595-CC1125RHBT
footprint QFN32_0.5-PAD(5X5) (QFN, 32-Leads, Body 5.2x5.2mm (max), Pitch 0.50mm, IPC Medium Density)
pins: 1 VDD_GUARD, 2 RESET_N, 3 GPIO3, 4 GPIO2, 5 DVDD_1, 6 DCPL, 7 SI, 8 SCLK, 9 SO(GPIO1), 10 GPIO0, 11 CSN, 12 DVDD_2, 13 AVDD_IF, 14 RBIAS, 15 AVDD_RF, 16 N.C., 17 PA, 18 TRX_SW, 19 LNA_P, 20 LNA_N, 21 DCPL_VCO, 22 AVDD_SYNTH1, 23 LPF0, 24 LPF1, 25 AVDD_PFD_CHP, 26 DCPL_PFD_CHP, 27 AVDD_SYNTH2, 28 AVDD_XOSC, 29 DCPL_XOSC, 30 XOSC_Q1, 31 XOSC_Q2, 32 EXT_XOSC, 33 GND

## CC2500RGPR
designator U?
Integrated Circuit; Manufacturer_Name: Texas Instruments; Manufacturer_Part_Number: CC2500RGPR; Datasheet Link: http://www.ti.com/general/docs/lit/getliterature.tsp?genericPartNumber=CC2500&&fileType=pdf; Height: 1mm; Mouser Part Number: 595-CC2500RGPR; Mouser Price/Stock: https://www.mouser.com/Search/Refine.aspx?Keyword=595-CC2500RGPR
footprint QFN20_0.5-PAD(4X4)
pins: 1 SCLK, 2 SO_(GDO1), 3 GDO2, 4 DVDD, 5 DCOUPL, 6 GDO0_(ATEST), 7 CSN, 8 XOSC_Q1, 9 AVDD_1, 10 XOSC_Q2, 11 AVDD_2, 12 RF_P, 13 RF_N, 14 SVDD, 15 AVDD_3, 16 GND_1, 17 RBIAS, 18 DGUARD, 19 GND_2, 20 SI, 21 GND_(EXPOSED_DIE)

## CC2530F128RHAT
designator U?
Integrated Circuit; Manufacturer_Name: Texas Instruments; Manufacturer_Part_Number: CC2530F128RHAT; Datasheet Link: http://www.ti.com/lit/ds/symlink/cc2530.pdf; Height: 1mm; Mouser Part Number: 595-CC2530F128RHAT; Mouser Price/Stock: https://www.mouser.com/Search/Refine.aspx?Keyword=595-CC2530F128RHAT; RS Part Number: 1627232; RS Price/Stock: http://uk.rs-online.com/web/p/products/1627232
footprint QFN40_0.5-PAD(6X6) (QFN, 40-Leads, Body 6.2x6.2mm (max), Pitch 0.50mm, IPC Low Density)
pins: 1 GND_1, 2 GND_2, 3 GND_3, 4 GND_4, 5 P1_5, 6 P1_4, 7 P1_3, 8 P1_2, 9 P1_1, 10 DVDD2, 11 P1_0, 12 P0_7, 13 P0_6, 14 P0_5, 15 P0_4, 16 P0_3, 17 P0_2, 18 P0_1, 19 P0_0, 20 RESET_N, 21 AVDD5, 22 XOSC_Q1, 23 XOSC_Q2, 24 AVDD3, 25 RF_P, 26 RF_N, 27 AVDD2, 28 AVDD1, 29 AVDD4, 30 RBIAS, 31 AVDD6, 32 P2_4/XOSC32K_Q1, 33 P2_3/XOSC32K_Q2, 34 P2_2, 35 P2_1, 36 P2_0, 37 P1_7, 38 P1_6, 39 DVDD1, 40 DCOUPL, 41 GND_5
